# Altium footprint library Custom1.PcbLib: 554 footprints (part 11 of 35)
Each footprint in its own frame and in the unit in brackets; x right, y up, seen from the top. Pads: shape width x height; smd on the part's side, far side on the other; paste and mask are expansions set on the pad; w line width, h text height; cw(c..) or ccw(c..) is an arc to the next point about the centre after c.
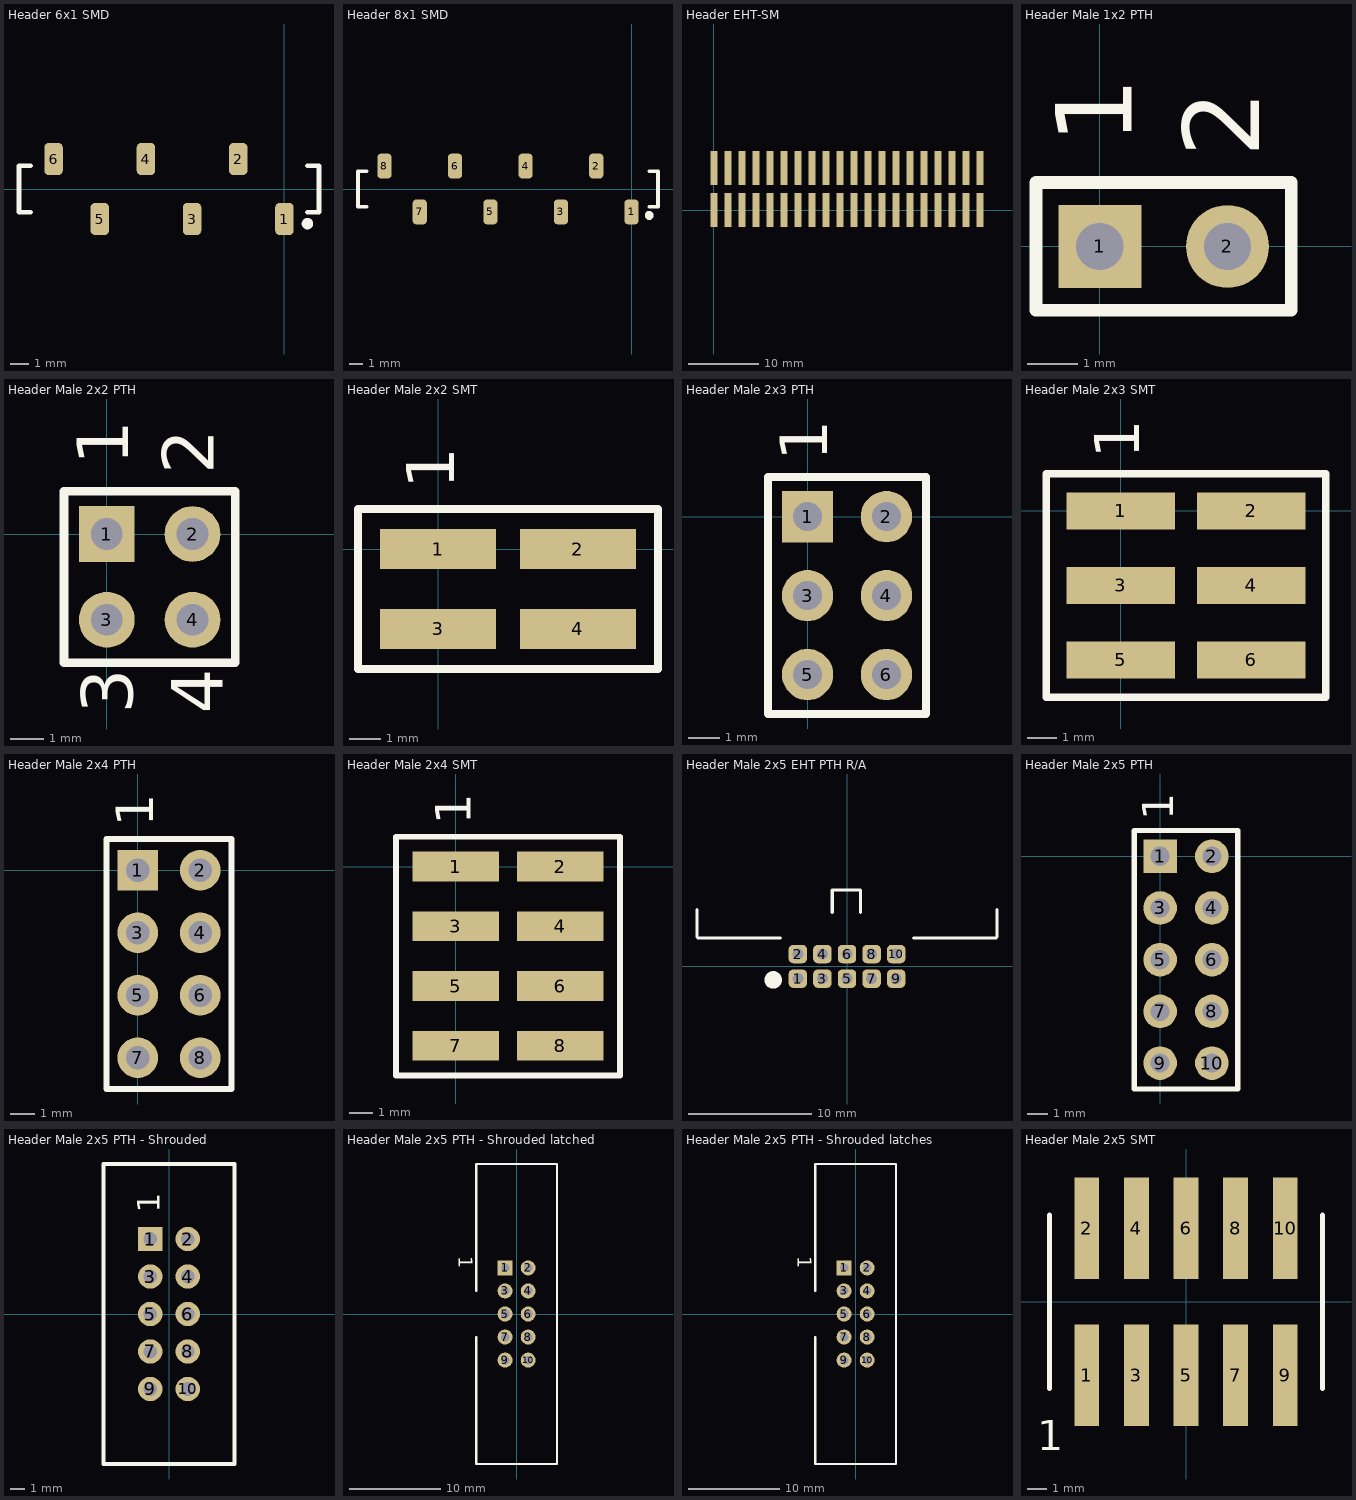
[diagram p10: the footprints below, top view; thin cyan lines are the x and y axes]

## Header 6x1 SMD [mil] "Header 6x1 SMD"
height 300
pads (6):
  rrect50% 40x70 smd: 1(0,-65) 2(-100,65) 3(-200,-65) 4(-300,65) 5(-400,-65) 6(-500,65)
Top Overlay:
  circle w15: c50,-75 r5
  lines w10: -550,-50 -575,-50 -575,50 -550,50 ; 50,-50 75,-50 75,50 50,50
3D body: height 140.48, standoff -809.1, extent -575,-50 75,50

## Header 8x1 SMD [mil] "Header 6x1 SMD"
height 300
pads (8):
  rrect50% 40x70 smd: 1(0,-65) 2(-100,65) 3(-200,-65) 4(-300,65) 5(-400,-65) 6(-500,65) 7(-600,-65) 8(-700,65)
Top Overlay:
  circle w15: c50,-75 r5
  lines w10: -750,-50 -775,-50 -775,50 -750,50 ; 50,-50 75,-50 75,50 50,50
3D body: height 140.48, standoff -809.1, extent -775,-50 75,50

## Header EHT-SM [mm]
pads (40):
  rect 1.02x4.806 smd paste-0.1: 1(0,0) 2(0,6) 3(2,0) 4(2,6) 5(4,0) 6(4,6) 7(6,0) 8(6,6) 9(8,0) 10(8,6) 11(10,0) 12(10,6) 13(12,0) 14(12,6) 15(14,0) 16(14,6) 17(16,0) 18(16,6) 19(18,0) 20(18,6) 21(20,0) 22(20,6) 23(22,0) 24(22,6) 25(24,0) 26(24,6) 27(26,0) 28(26,6) 29(28,0) 30(28,6) 31(30,0) 32(30,6) 33(32,0) 34(32,6) 35(34,0) 36(34,6) 37(36,0) 38(36,6) 39(38,0) 40(38,6)
3D body "EHT-120-01-S-D-SM.stp": height 12.35, standoff -0.01, extent -8.205,-1.625 46.176,7.286

## Header Male 1x2 PTH [mil]
height 230
pads (2):
  rect 65x65 hole 37: 1(0,0)
  round 65 hole 37: 2(100,0)
Top Overlay:
  lines w10: -50,-50 -50,50 150,50 150,-50 -50,-50
  text "2" at 125,70 h60
  text "1" at 25,80 h60
3D body: height 225, standoff 25, extent -50,-50 150,50

## Header Male 2x2 PTH [mil]
height 230
pads (4):
  rect 65x65 hole 37: 1(0,0)
  round 65 hole 37: 2(100,0) 3(0,-100) 4(100,-100)
Top Overlay:
  lines w10: -50,-150 150,-150 150,50 -50,50 -50,-150
  text "1" at 25,80 h60
  text "2" at 125,70 h60
  text "3" at 30,-210 h60
  text "4" at 135,-210 h60
3D body "Pin Header 2x2 TH Pitch 2.54mm.stp": height 373.85, standoff -125.98, extent -50,-150 150,50

## Header Male 2x2 SMT [mil]
height 230
pads (4):
  rect 145x50 smd: 1(0,0) 2(175,0) 3(0,-100) 4(175,-100)
Top Overlay:
  lines w10: -100,-150 -100,50 275,50 275,-150 -100,-150
  text "1" at 20,75 h60
3D body "015910040.stp": height 380.5, standoff 0.5, extent -50,-150 225,50

## Header Male 2x3 PTH [mil]
height 230
pads (6):
  rect 65x65 hole 37: 1(0,0)
  round 65 hole 37: 2(100,0) 3(0,-100) 4(100,-100) 5(0,-200) 6(100,-200)
Top Overlay:
  lines w10: -50,-250 150,-250 150,50 -50,50 -50,-250
  text "1" at 25,70 h60
3D body "Pin Header 2x3 TH Pitch 2.54mm.stp": height 373.85, standoff -125.98, extent -50,-250 150,50

## Header Male 2x3 SMT [mil]
height 230
pads (6):
  rect 145x50 smd: 1(0,0) 2(175,0) 3(0,-100) 4(175,-100) 5(0,-200) 6(175,-200)
Top Overlay:
  lines w10: -100,-250 -100,50 275,50 275,-250 -100,-250
  text "1" at 25,70 h60
3D body "015910060.stp": height 380.5, standoff 0.5, extent -47.5,-249.99 227.5,50.01

## Header Male 2x4 PTH [mil]
height 230
pads (8):
  rect 65x65 hole 37: 1(0,0)
  round 65 hole 37: 2(100,0) 3(0,-100) 4(100,-100) 5(0,-200) 6(100,-200) 7(0,-300) 8(100,-300)
Top Overlay:
  lines w10: -50,-350 150,-350 150,50 -50,50 -50,-350
  text "1" at 25,70 h60
3D body "Pin Header 2x4 TH Pitch 2.54mm.stp": height 373.85, standoff -125.98, extent -50,-350 150,50
3D body "Pin Header 2x4 TH Pitch 2.54mm.stp": height 373.85, standoff -125.98, extent -50,-350 150,50

## Header Male 2x4 SMT [mil]
height 230
pads (8):
  rect 145x50 smd: 1(0,0) 2(175,0) 3(0,-100) 4(175,-100) 5(0,-200) 6(175,-200) 7(0,-300) 8(175,-300)
Top Overlay:
  lines w10: -100,-350 275,-350 275,50 -100,50 -100,-350
  text "1" at 25,70 h60
3D body "015910080.stp": height 380.5, standoff 0.5, extent -52.5,-350 222.5,50

## Header Male 2x5 EHT PTH R/A [mm]
pads (10):
  rrect50% 1.5x1.5 hole 0.89: 1(-4,-1) 2(-4,1) 3(-2,-1) 4(-2,1) 5(0,-1) 6(0,1) 7(2,-1) 8(2,1) 9(4,-1) 10(4,1)
Top Overlay:
  circle w0.7: c-6,-1.1 r0.361
  lines w0.254: -12.2,4.6 -12.2,2.4 -12.1,2.3 -5.4,2.3 ; -1.2,4.4 -1.2,6.2 -0.325,6.2 0.225,6.2 1.1,6.2 1.1,4.4 ; 5.4,2.3 12.1,2.3 12.2,2.4 12.2,4.6
3D body "EHT-105-01-S-D-RA.stp": height 7.63, standoff -3.04, extent -12.2,-1.277 12.19,14.692

## Header Male 2x5 PTH [mil]
height 230
pads (10):
  rect 65x65 hole 37: 1(0,0)
  round 65 hole 37: 2(100,0) 3(0,-100) 4(100,-100) 5(0,-200) 6(100,-200) 7(0,-300) 8(100,-300) 9(0,-400) 10(100,-400)
Top Overlay:
  lines w10: -50,-450 -50,50 150,50 150,-450 -50,-450
  text "1" at 25,70 h60
3D body "Pin Header 2x5 TH Pitch 2.54mm.stp": height 373.85, standoff -125.98, extent -50,-450 150,50

## Header Male 2x5 PTH - Shrouded [mil]
height 230
pads (10):
  rect 65x65 hole 37: 1(-50,200)
  round 65 hole 37: 2(50,200) 3(-50,100) 4(50,100) 5(-50,0) 6(50,0) 7(-50,-100) 8(50,-100) 9(-50,-200) 10(50,-200)
Top Overlay:
  lines w10: -175,-400 175,-400 175,400 -175,400 -175,-400
  text "1" at -25,270 h60
3D body "30310-6002.stp": height 350, standoff -125, extent -167,-399 180,400

## Header Male 2x5 PTH - Shrouded latched [mil]
height 230
pads (10):
  rect 65x65 hole 37: 1(-50,200)
  round 65 hole 37: 2(50,200) 3(-50,100) 4(50,100) 5(-50,0) 6(50,0) 7(-50,-100) 8(50,-100) 9(-50,-200) 10(50,-200)
Top Overlay:
  lines w10: -175,-100 -175,-650 175,-650 175,650 -175,650 -175,100
  text "1" at -250,250 h60
3D body "30310-6002.stp": height 350, standoff -125, extent -167,-399 180,400

## Header Male 2x5 PTH - Shrouded latches [mil]
height 230
pads (10):
  rect 65x65 hole 37: 1(-50,200)
  round 65 hole 37: 2(50,200) 3(-50,100) 4(50,100) 5(-50,0) 6(50,0) 7(-50,-100) 8(50,-100) 9(-50,-200) 10(50,-200)
Top Overlay:
  lines w10: -175,-100 -175,-650 175,-650 175,650 -175,650 -175,100
  text "1" at -250,250 h60
3D body "30310-6002.stp": height 350, standoff -125, extent -167,-399 180,400

## Header Male 2x5 SMT [mil]
height 230
pads (10):
  rect 50x205 smd: 1(-200.01,-148) 2(-200.01,148) 3(-100.01,-148) 4(-100.01,148) 5(-0.01,-148) 6(-0.01,148) 7(99.99,-148) 8(99.99,148) 9(199.99,-148) 10(199.99,148)
Top Overlay:
  lines w10: -275,-175 -275,175 ; 275,-175 275,175
  text "1" at -300,-300 h60